# Altium footprint library PcbLib.PcbLib: 142 footprints (part 7 of 9)
Each footprint in its own frame and in the unit in brackets; x right, y up, seen from the top. Pads: shape width x height; smd on the part's side, far side on the other; paste and mask are expansions set on the pad; w line width, h text height; cw(c..) or ccw(c..) is an arc to the next point about the centre after c.
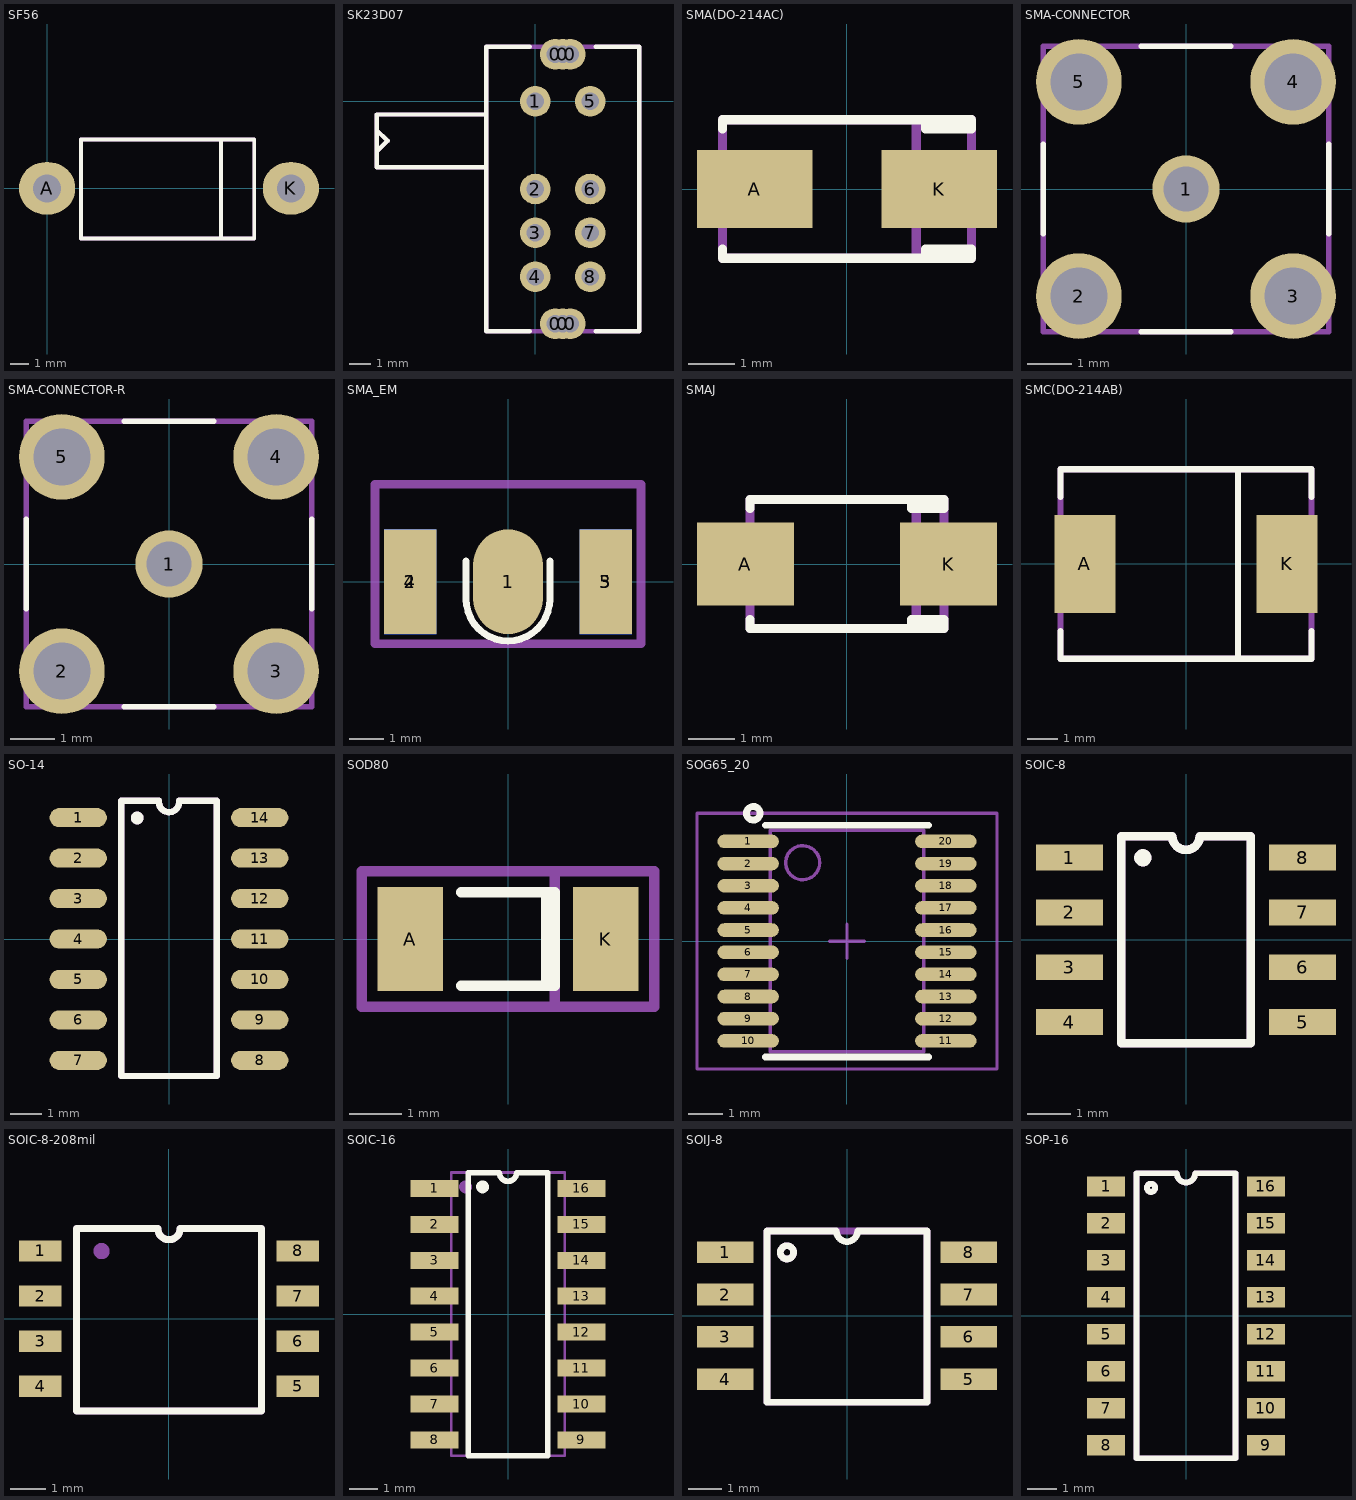
[diagram p6: the footprints below, top view; thin cyan lines are the x and y axes]

## SF56 [mm]
pads (2):
  oval 3x2.8 hole 1.5: A(0,0) K(13,0)
Top Overlay:
  lines w0.2: 9.271,-2.667 9.271,2.54 ; 1.8,-2.669 11.049,-2.669 11.049,2.6 1.8,2.6 1.8,-2.669
Mechanical 29:
  lines w0.2: 9.271,-2.667 9.271,2.54 ; 1.8,-2.669 11.049,-2.669 11.049,2.6 1.8,2.6 1.8,-2.669
  text ".Designator" at 4.6,-0.267 h1

## SK23D07 [mm]
pads (14):
  round 1.4 hole 0.8: 0(0.9,-10.15) 0(0.9,2.15) 0(1.25,-10.15) 0(1.25,2.15) 0(1.6,-10.15) 0(1.6,2.15) 1(0,0) 2(0,-4) 3(0,-6) 4(0,-8) 5(2.5,0) 6(2.5,-4) 7(2.5,-6) 8(2.5,-8)
Top Overlay:
  lines w0.2: -7.25,-2.3 -6.75,-1.8 -7.25,-1.3 ; -2.25,-3 -7.25,-3 -7.25,-0.6 -2.25,-0.6 ; -0.25,-10.5 -2.25,-10.5 -2.25,2.5 -0.25,2.5 ; 2.75,-10.5 4.75,-10.5 4.75,2.5 2.75,2.5 ; -7.25,-1.3 -7.25,-1.3
Mechanical 29:
  lines w0.2: -7.25,-2.3 -6.75,-1.8 -7.25,-1.3 ; -2.25,-3 -7.25,-3 -7.25,-0.6 -2.25,-0.6 ; -7.25,-1.3 -7.25,-1.3 ; -2.25,-10.5 -2.25,2.5 4.75,2.5 4.75,-10.5 -2.25,-10.5
  text ".Designator" at 1.717,-5.8 h1
3D body "SK23D07.STEP": height 4.8, standoff -2.4, extent -7.175,-10.325 4.625,2.375

## SMA(DO-214AC) [mm]
pads (2):
  rect 2.5x1.7 smd: A(-2,0) K(2,0)
Top Overlay:
  lines w0.2: -2.7,-1.3 -2.7,-1.5 2.7,-1.5 2.7,-1.3 1.7,-1.3 1.7,-1.5 ; -2.7,1.3 -2.7,1.5 2.7,1.5 2.7,1.3 1.7,1.3 1.7,1.5 ; 1.7,-1.4 2.7,-1.4 ; 1.7,1.4 2.7,1.4
Mechanical 29:
  lines w0.2: 1.5,-1.5 1.5,1.5 ; -2.7,-1.5 2.7,-1.5 2.7,1.5 -2.7,1.5 -2.7,-1.5
  text ".Designator" at -1.4,-0.267 h1
3D body "User Library-SMAJ.step": height 2, standoff 0.01, extent -2.465,-1.27 2.465,1.27

## SMA-CONNECTOR [mm]
height 8.3
pads (5):
  round 1.508 hole 1: 1(0,0)
  round 1.92 hole 1.28: 2(-2.4,-2.4) 3(2.4,-2.4) 4(2.4,2.4) 5(-2.4,2.4)
Top Overlay:
  lines w0.127: -3.2,-1 -3.2,1 ; -1,-3.2 1,-3.2 ; -1,3.2 1,3.2 ; 3.2,-1 3.2,1
Mechanical 29:
  lines w0.127: -3.2,-3.2 -3.2,3.2 3.2,3.2 3.2,-3.2 -3.2,-3.2
  text ".Designator" at -1.4,-0.267 h1
3D body "step_temp.STEP": height 11.6, standoff -2, extent -3.25,-3.25 3.25,3.25

## SMA-CONNECTOR-R [mm]
height 8.3
pads (5):
  round 1.508 hole 1: 1(0,0)
  round 1.92 hole 1.28: 2(-2.4,-2.4) 3(2.4,-2.4) 4(2.4,2.4) 5(-2.4,2.4)
Top Overlay:
  lines w0.127: -3.2,-1 -3.2,1 ; -1,-3.2 1,-3.2 ; -1,3.2 1,3.2 ; 3.2,-1 3.2,1
Mechanical 29:
  lines w0.127: -3.2,-3.2 -3.2,3.2 3.2,3.2 3.2,-3.2 -3.2,-3.2
  text ".Designator" at -1.4,-0.267 h1
3D body "SMA-angled.STEP": height 11.8, standoff -2, extent -3.5,-11 3.5,3.5

## SMA_EM [mm] "SMA-J-P-H-ST-EM1 edge mounting"
pads (5):
  oval 2x3 smd: 1(0,0)
  rect 1.5x3 smd: 2(-2.8,0) 3(2.8,0)
  rect 1.5x3 smd far side: 4(-2.8,0) 5(2.8,0)
Top Overlay:
  lines w0.2: -1.2,0.6 -1.2,-0.5 ccw(c0,-0.5) 1.2,-0.5 1.2,0.6
Mechanical 29:
  lines w0.254: -3.81,-1.778 -2.54,-1.778 3.81,-1.778 3.81,2.794 -3.81,2.794 -3.81,-1.778
  text ".Designator" at -1.832,0.279 h1
3D body "SMA-J-P-H-ST-EM1.STEP": height 3.51, standoff -2.84, extent -3.175,-1.1 3.175,12.23

## SMAJ [mm]
pads (2):
  rect 2.1x1.8 smd: A(-2.2,0) K(2.2,0)
Top Overlay:
  lines w0.2: -2.1,-1.2 -2.1,-1.4 2.1,-1.4 2.1,-1.2 1.4,-1.2 1.4,-1.4 ; -2.1,1.2 -2.1,1.4 2.1,1.4 2.1,1.2 1.4,1.2 1.4,1.4 ; 1.4,-1.3 2.1,-1.3 ; 1.4,1.3 2.1,1.3
Mechanical 29:
  lines w0.2: 1.5,-1.4 1.5,1.4 ; -2.1,-1.4 -2.1,1.4 2.1,1.4 2.1,-1.4 -2.1,-1.4
  text ".Designator" at -1.2,-0.367 h1
3D body "User Library-SMAJ.step": height 2, standoff 0.01, extent -2.465,-1.27 2.465,1.27

## SMC(DO-214AB) [mm]
pads (2):
  rect 2x3.2 smd: A(-3.305,0) K(3.305,0)
Top Overlay:
  lines w0.2: -4.1,-2.2 -4.1,-3.1 4.1,-3.1 4.1,-2.2 ; -4.1,2.2 -4.1,3.1 4.1,3.1 4.1,2.2 ; 1.7,-3.1 1.7,3.1
Mechanical 29:
  lines w0.2: 1.7,-3.1 1.7,3.1 ; -4.1,-3.1 -4.1,3.1 4.1,3.1 4.1,-3.1 -4.1,-3.1
  text ".Designator" at -1.2,-0.467 h1
3D body "SS34.STEP": height 2.5, standoff 0, extent -3.95,-2.9 3.95,2.9

## SO-14 [mm]
pads (14):
  oval 1.8x0.6 smd: 1(-2.85,3.81) 2(-2.85,2.54) 3(-2.85,1.27) 4(-2.85,0) 5(-2.85,-1.27) 6(-2.85,-2.54) 7(-2.85,-3.81) 8(2.85,-3.81) 9(2.85,-2.54) 10(2.85,-1.27) 11(2.85,0) 12(2.85,1.27) 13(2.85,2.54) 14(2.85,3.81)
Top Overlay:
  circle w0.2: c-1,3.8 r0.1
  lines w0.2: -0.315,4.339 ccw(c0,4.3) 0.316,4.33 ; -0.315,4.345 -1.5,4.345 -1.5,-4.3 1.5,-4.3 1.5,4.345 0.316,4.345
Mechanical 29:
  circle w0.2: c-1,3.8 r0.1
  lines w0.2: -0.315,4.339 ccw(c0,4.3) 0.316,4.33 ; -0.315,4.345 -1.5,4.345 -1.5,-4.3 1.5,-4.3 1.5,4.345 0.316,4.345
  text ".Designator" at 0.367,-1.3 h1
3D body "User Library-so14-1.step": height 1.7, standoff 0, extent -3,-4.4 3,4.4

## SOD80 [mm] "MiniMELF"
pads (2):
  rect 1.25x2 smd: A(-1.875,0) K(1.875,0)
Top Overlay:
  lines w0.2: -0.9,-0.9 0.9,-0.9 0.9,0.9 -0.9,0.9 ; 0.729,-0.9 0.729,0.9
Mechanical 29:
  lines w0.2: 0.9,-1.3 0.9,1.3 ; -2.8,-1.3 2.8,-1.3 2.8,1.3 -2.8,1.3 -2.8,-1.3
  text ".Designator" at -2,-0.467 h1
3D body "User Library-MiniMelf-2.step": height 1.6, standoff 0, extent -1.82,-0.8 1.88,0.8

## SOG65_20 [mm] "PW TSSOP (TI), MO-153-AC (JEDEC), 20Lead, pitch: 0.65mm, 6.5x4.4x1.2mm"
height 1.2
pads (20):
  oval 1.8x0.4 smd mask+0.075: 1(-2.9,2.925) 2(-2.9,2.275) 3(-2.9,1.625) 4(-2.9,0.975) 5(-2.9,0.325) 6(-2.9,-0.325) 7(-2.9,-0.975) 8(-2.9,-1.625) 9(-2.9,-2.275) 10(-2.9,-2.925) 11(2.9,-2.925) 12(2.9,-2.275) 13(2.9,-1.625) 14(2.9,-0.975) 15(2.9,-0.325) 16(2.9,0.325) 17(2.9,0.975) 18(2.9,1.625) 19(2.9,2.275) 20(2.9,2.925)
Top Overlay:
  circle w0.2: c-2.75,3.75 r0.2
  lines w0.2: -2.4,-3.4 2.4,-3.4 ; -2.4,3.4 2.4,3.4
Mechanical 29:
  circle w0.1: c-1.3,2.3 r0.5
  lines w0.1: -2.25,-3.25 -2.25,3.25 2.25,3.25 2.25,-3.25 -2.25,-3.25
Mechanical 15:
  lines w0.1: -0.5,0 0.5,0 ; 0,-0.5 0,0.5 ; -4.4,-3.75 -4.4,3.75 4.4,3.75 4.4,-3.75 -4.4,-3.75
3D body "User Library-TSSOP-20-2.STEP": height 1.2, standoff 0, extent -3.2,-3.25 3.2,3.25

## SOIC-8 [mm]
pads (8):
  rect 1.55x0.6 smd: 1(-2.7,1.905) 2(-2.7,0.635) 3(-2.7,-0.635) 4(-2.7,-1.905) 5(2.7,-1.905) 6(2.7,-0.635) 7(2.7,0.635) 8(2.7,1.905)
Top Overlay:
  circle w0.2: c-1,1.9 r0.1
  lines w0.2: -1.5,-2.4 -1.5,2.4 -0.318,2.4 ccw(c0,2.4) 0.318,2.4 1.5,2.4 1.5,-2.4 -1.5,-2.4
Mechanical 29:
  circle w0.2: c-1,1.9 r0.1
  lines w0.2: -1.5,-2.4 -1.5,2.4 -0.318,2.4 ccw(c0,2.4) 0.318,2.4 1.5,2.4 1.5,-2.4 -1.5,-2.4
  text ".Designator" at -0.9,-0.467 h1
3D body "User Library-so8-3.step": height 1.7, standoff 0, extent -3,-2.45 3,2.45

## SOIC-8-208mil [mm]
pads (8):
  rect 1.2x0.6 smd: 1(-3.625,1.905) 2(-3.625,0.635) 3(-3.625,-0.635) 4(-3.625,-1.905) 5(3.625,-1.905) 6(3.625,-0.635) 7(3.625,0.635) 8(3.625,1.905)
Top Overlay:
  lines w0.2: -2.6,-2.6 -2.6,2.54 -0.318,2.54 ccw(c0,2.54) 0.318,2.54 2.6,2.54 2.6,-2.6 -2.6,-2.6
Mechanical 29:
  circle w0.254: c-1.9,1.9 r0.1
  lines w0.2: -2.6,-2.6 -2.6,2.54 -0.318,2.54 ccw(c0,2.54) 0.318,2.54 2.6,2.54 2.6,-2.6 -2.6,-2.6
  text ".Designaror" at -0.9,-0.333 h0.8
3D body "MY SOIC 8.STEP": height 1.95, standoff 0, extent -3.912,-2.642 3.988,2.638

## SOIC-16 [mm]
pads (16):
  rect 1.7x0.6 smd: 1(-2.591,4.445) 2(-2.591,3.175) 3(-2.591,1.905) 4(-2.591,0.635) 5(-2.591,-0.635) 6(-2.591,-1.905) 7(-2.591,-3.175) 8(-2.591,-4.445) 9(2.591,-4.445) 10(2.591,-3.175) 11(2.591,-1.905) 12(2.591,-0.635) 13(2.591,0.635) 14(2.591,1.905) 15(2.591,3.175) 16(2.591,4.445)
Top Overlay:
  circle w0.254: c-0.9,4.5 r0.1
  lines w0.2: -1.4,-4.996 -1.4,5.004 ; -1.396,-4.996 -1.392,-5 1.4,-5 1.4,5 1.396,5.004 0.305,5.004 cw(c0,5.004) -0.305,5.004 -1.396,5.004
Mechanical 29:
  circle w0.254: c-1.5,4.5 r0.1
  lines w0.1: -1.575,-5.004 1.575,-5.004 ; -1.575,5.004 -0.305,5.004 ; 1.575,5.004 0.305,5.004 ; -0.305,5.004 -2.007,5.004 -2.007,-5.004 2.007,-5.004 2.007,5.004 0.305,5.004 ; -0.305,5.004 0.305,5.004
  text ".Designator" at 0.467,-2.1 h1
3D body "User Library-SOIC-16-1.step": height 1.4, standoff 0, extent -3,-4.95 3,4.95

## SOIJ-8 [mm]
pads (8):
  rect 1.7x0.65 smd: 1(-3.65,1.905) 2(-3.65,0.635) 3(-3.65,-0.635) 4(-3.65,-1.905) 5(3.65,-1.905) 6(3.65,-0.635) 7(3.65,0.635) 8(3.65,1.905)
Top Overlay:
  circle w0.2: c-1.8,1.9 r0.2
  lines w0.2: -2.4,-2.6 -2.4,2.54 -0.318,2.54 ccw(c0,2.54) 0.318,2.54 2.4,2.54 2.4,-2.6 -2.4,-2.6
Mechanical 29:
  circle w0.2: c-1.8,1.9 r0.2
  lines w0.2: -2.4,-2.6 -0.3,-2.6 2.4,-2.6 2.4,2.54 -2.4,2.54 -2.4,-2.6
  text ".Designator" at -1.6,-0.934 h2
3D body "SOIJ-8_2.STEP": height 2.09, standoff 0.02, extent -3.945,-2.675 3.995,2.585

## SOP-16 [mm]
pads (16):
  rect 1.3x0.7 smd: 1(-2.75,4.445) 2(-2.75,3.175) 3(-2.75,1.905) 4(-2.75,0.635) 5(-2.75,-0.635) 6(-2.75,-1.905) 7(-2.75,-3.175) 8(-2.75,-4.445) 9(2.75,-4.445) 10(2.75,-3.175) 11(2.75,-1.905) 12(2.75,-0.635) 13(2.75,0.635) 14(2.75,1.905) 15(2.75,3.175) 16(2.75,4.445)
Top Overlay:
  circle w0.2: c-1.2,4.4 r0.141
  lines w0.2: -1.7,-4.9 1.7,-4.9 1.7,4.9 0.318,4.9 cw(c0,4.9) -0.318,4.9 -1.7,4.9 -1.7,-4.9
Mechanical 29:
  circle w0.2: c-1.2,4.4 r0.141
  lines w0.2: -1.7,-4.9 1.7,-4.9 1.7,4.9 0.318,4.9 cw(c0,4.9) -0.318,4.9 -1.7,4.9 -1.7,-4.9
  text ".Designator" at 0.367,-0.8 h1
3D body "User Library-sop16-1.step": height 1.58, standoff 0, extent -3.117,-4.991 3.117,4.99